# Altium footprint library standard.PcbLib: 330 footprints (part 15 of 21)
Each footprint in its own frame and in the unit in brackets; x right, y up, seen from the top. Pads: shape width x height; smd on the part's side, far side on the other; paste and mask are expansions set on the pad; w line width, h text height; cw(c..) or ccw(c..) is an arc to the next point about the centre after c.
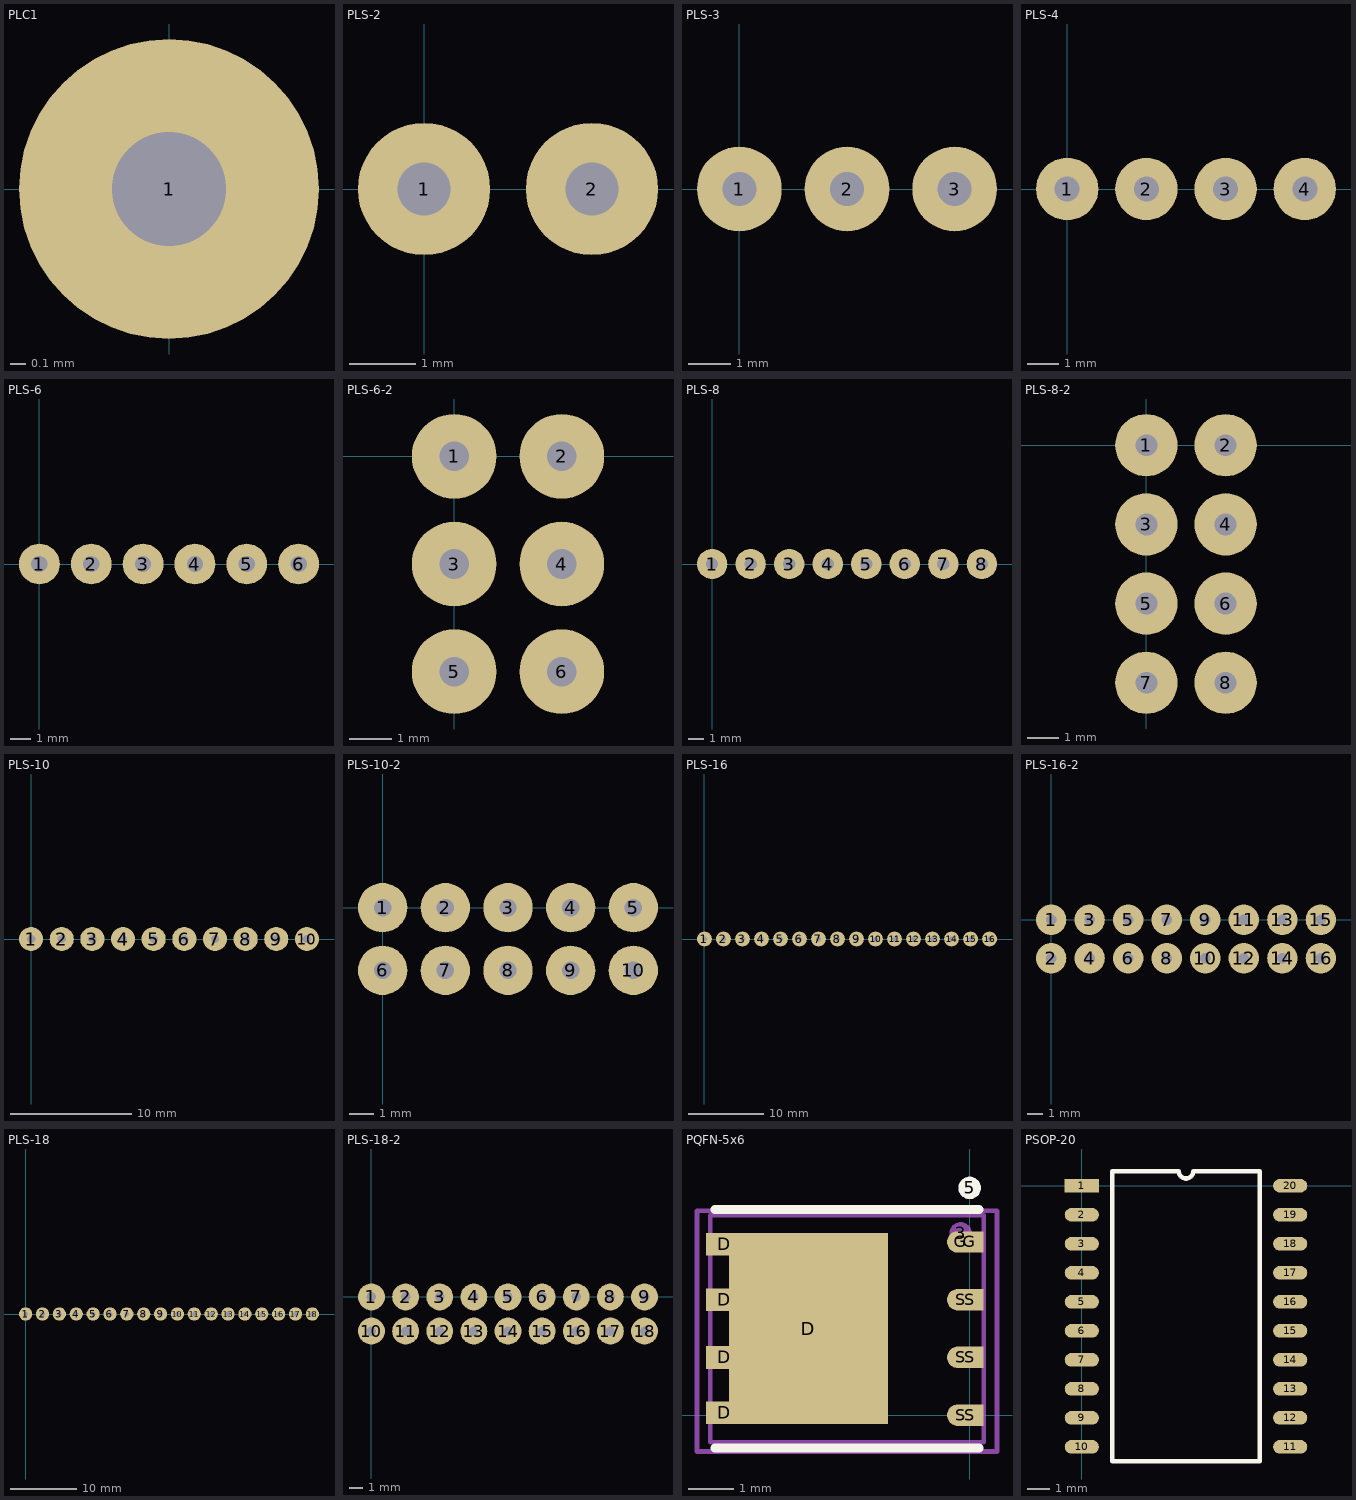
[diagram p14: the footprints below, top view; thin cyan lines are the x and y axes]

## PLC1 [mm]
pads (1):
  round 2 hole 0.762: 1(0,0)

## PLS-2 [mm]
pads (2):
  round 2 hole 0.8: 1(0,0) 2(2.54,0)

## PLS-3 [mm]
pads (3):
  round 2 hole 0.8: 1(0,0) 2(2.54,0) 3(5.08,0)

## PLS-4 [mm]
pads (4):
  round 2 hole 0.8: 1(0,0) 2(2.54,0) 3(5.08,0) 4(7.62,0)

## PLS-6 [mm]
pads (6):
  round 2 hole 0.8: 1(0,0) 2(2.54,0) 3(5.08,0) 4(7.62,0) 5(10.16,0) 6(12.7,0)

## PLS-6-2 [mm]
pads (6):
  round 2 hole 0.7: 1(0,0) 2(2.54,0) 3(0,-2.54) 4(2.54,-2.54) 5(0,-5.08) 6(2.54,-5.08)

## PLS-8 [mm]
pads (8):
  round 2 hole 0.8: 1(0,0) 2(2.54,0) 3(5.08,0) 4(7.62,0) 5(10.16,0) 6(12.7,0) 7(15.24,0) 8(17.78,0)

## PLS-8-2 [mm]
pads (8):
  round 2 hole 0.7: 1(0,0) 2(2.54,0) 3(0,-2.54) 4(2.54,-2.54) 5(0,-5.08) 6(2.54,-5.08) 7(0,-7.62) 8(2.54,-7.62)

## PLS-10 [mm]
pads (10):
  round 2 hole 0.7: 1(0,0) 2(2.54,0) 3(5.08,0) 4(7.62,0) 5(10.16,0) 6(12.7,0) 7(15.24,0) 8(17.78,0) 9(20.32,0) 10(22.86,0)

## PLS-10-2 [mm]
height 10
pads (10):
  round 2 hole 0.7: 1(0,0) 2(2.54,0) 3(5.08,0) 4(7.62,0) 5(10.16,0) 6(0,-2.54) 7(2.54,-2.54) 8(5.08,-2.54) 9(7.62,-2.54) 10(10.16,-2.54)

## PLS-16 [mm]
height 10
pads (16):
  round 2 hole 0.7: 1(0,0) 2(2.54,0) 3(5.08,0) 4(7.62,0) 5(10.16,0) 6(12.7,0) 7(15.24,0) 8(17.78,0) 9(20.32,0) 10(22.86,0) 11(25.4,0) 12(27.94,0) 13(30.48,0) 14(33.02,0) 15(35.56,0) 16(38.1,0)

## PLS-16-2 [mm]
height 10
pads (16):
  round 2 hole 0.7: 1(0,0) 2(0,-2.54) 3(2.54,0) 4(2.54,-2.54) 5(5.08,0) 6(5.08,-2.54) 7(7.62,0) 8(7.62,-2.54) 9(10.16,0) 10(10.16,-2.54) 11(12.7,0) 12(12.7,-2.54) 13(15.24,0) 14(15.24,-2.54) 15(17.78,0) 16(17.78,-2.54)

## PLS-18 [mm]
pads (18):
  round 2 hole 0.7: 1(0,0) 2(2.54,0) 3(5.08,0) 4(7.62,0) 5(10.16,0) 6(12.7,0) 7(15.24,0) 8(17.78,0) 9(20.32,0) 10(22.86,0) 11(25.4,0) 12(27.94,0) 13(30.48,0) 14(33.02,0) 15(35.56,0) 16(38.1,0) 17(40.64,0) 18(43.18,0)

## PLS-18-2 [mm]
pads (18):
  round 2 hole 0.7: 1(0,0) 2(2.54,0) 3(5.08,0) 4(7.62,0) 5(10.16,0) 6(12.7,0) 7(15.24,0) 8(17.78,0) 9(20.32,0) 10(0,-2.54) 11(2.54,-2.54) 12(5.08,-2.54) 13(7.62,-2.54) 14(10.16,-2.54) 15(12.7,-2.54) 16(15.24,-2.54) 17(17.78,-2.54) 18(20.32,-2.54)

## PQFN-5x6 [mm]
pads (15):
  round 0.5 on Mech1: 3(-0.2,4)
  round 0.5 on Top Overlay: 5(0,5)
  rrect0% 0.8x0.5 smd: D(-5.4,0.05) D(-5.4,1.27) D(-5.4,2.54) D(-5.4,3.76)
  rect 3.5x4.21 smd: D(-3.55,1.905)
  oval 0.6x0.47 smd: G(-0.2,3.81) S(-0.2,0) S(-0.2,1.27) S(-0.2,2.54)
  rrect0% 0.6x0.47 smd: G(0,3.81) S(0,0) S(0,1.27) S(0,2.54)
Top Overlay:
  lines w0.2: -5.6,-0.725 0.2,-0.725 ; -5.6,4.525 0.2,4.525
Mechanical 1:
  lines w0.1: -5.71,-0.6 0.31,-0.6 0.31,4.4 -5.71,4.4 -5.71,-0.6
Mechanical 15:
  lines w0.1: -6,-0.8 0.6,-0.8 0.6,4.5 -6,4.5 -6,-0.8
3D body "User Library-PQFN 5x6.STEP": height 0.9, standoff 0, extent -5.71,-0.6 0.31,4.4

## PSOP-20 [mm]
pads (20):
  rect 1.5x0.6 smd: 1(0,0)
  oval 1.5x0.6 smd: 2(0,-1.27) 3(0,-2.54) 4(0,-3.81) 5(0,-5.08) 6(0,-6.35) 7(0,-7.62) 8(0,-8.89) 9(0,-10.16) 10(0,-11.43) 11(9.12,-11.43) 12(9.12,-10.16) 13(9.12,-8.89) 14(9.12,-7.62) 15(9.12,-6.35) 16(9.12,-5.08) 17(9.12,-3.81) 18(9.12,-2.54) 19(9.12,-1.27) 20(9.12,0)
Top Overlay:
  lines w0.2: 1.335,-12.065 7.785,-12.065 7.785,0.635 4.877,0.635 cw(c4.56,0.635) 4.242,0.635 1.335,0.635 1.335,-12.065